# Altium footprint library 常用元件封装库.PcbLib: 1310 footprints (part 15 of 83)
Each footprint in its own frame and in the unit in brackets; x right, y up, seen from the top. Pads: shape width x height; smd on the part's side, far side on the other; paste and mask are expansions set on the pad; w line width, h text height; cw(c..) or ccw(c..) is an arc to the next point about the centre after c.
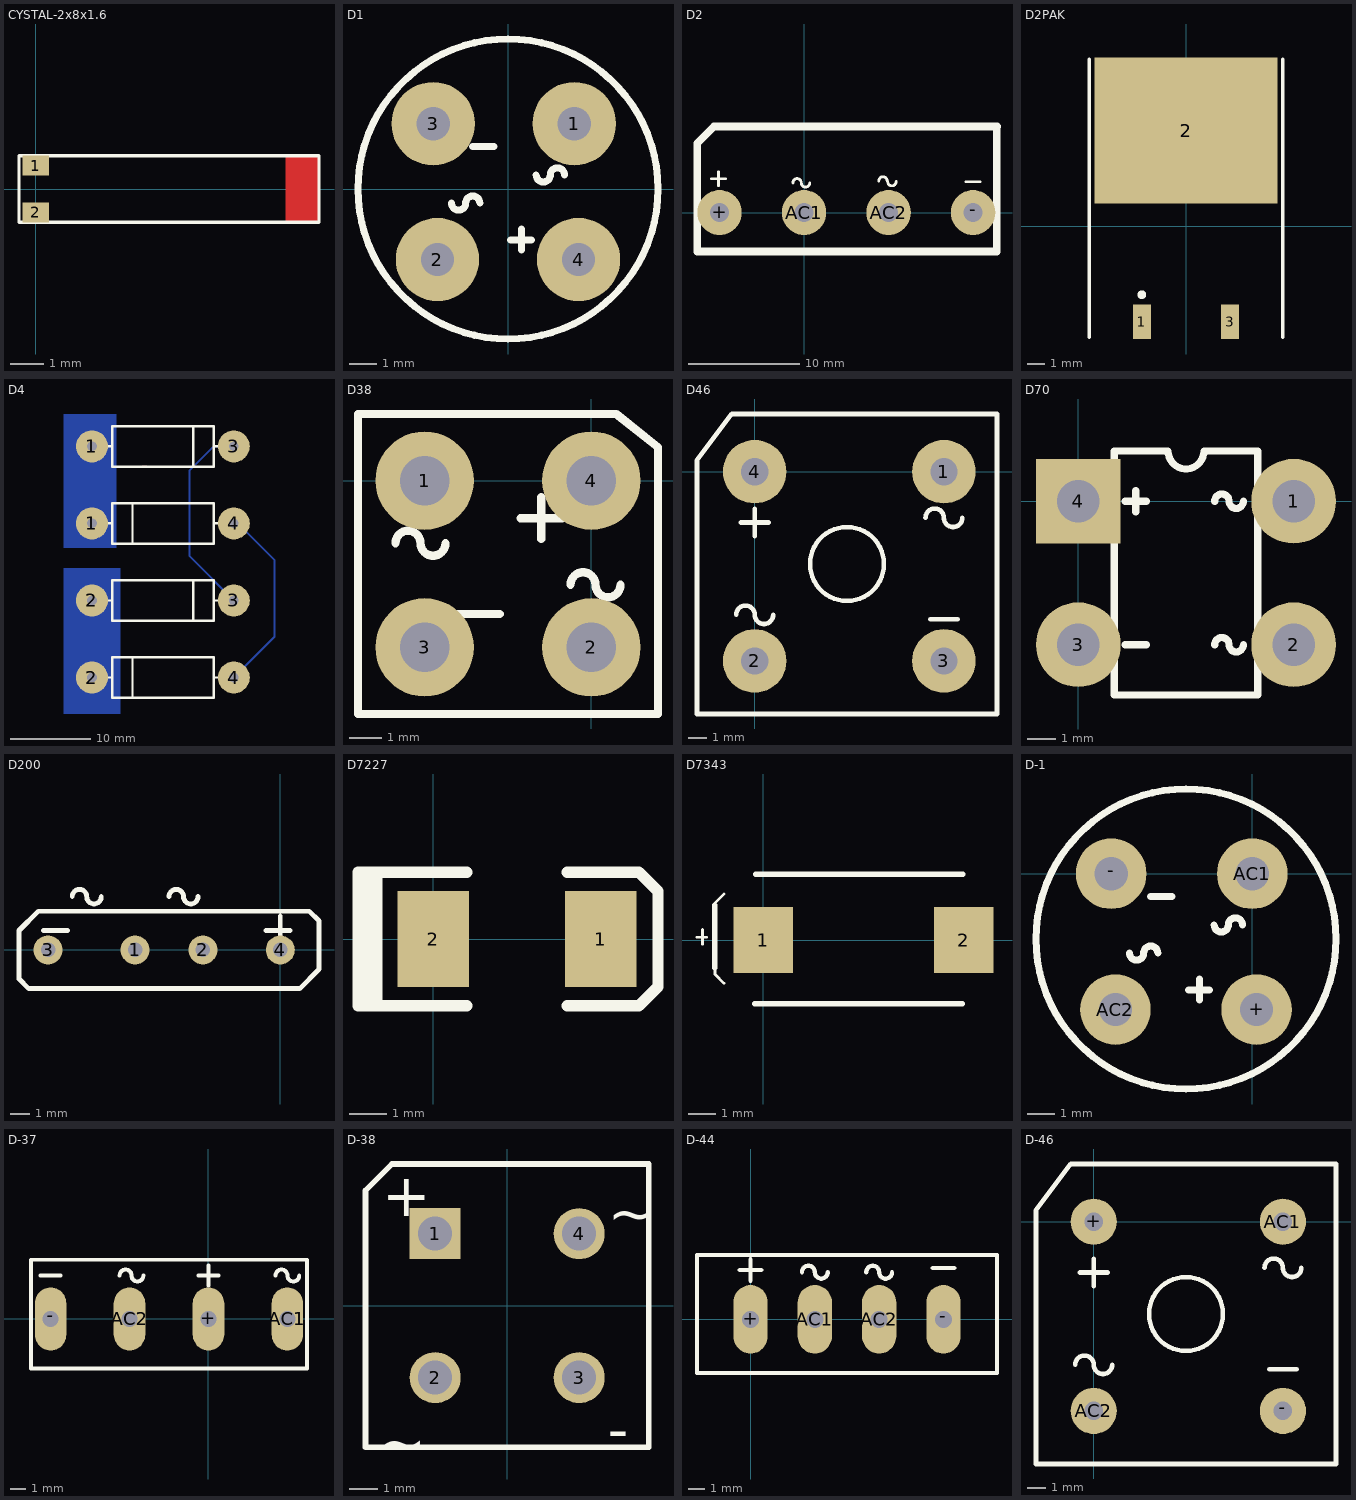
[diagram p14: the footprints below, top view; thin cyan lines are the x and y axes]

## CYSTAL-2x8x1.6 [mm]
pads (2):
  rect 0.8x0.6 smd: 1(0,0.7) 2(0,-0.7)
Top Layer:
  rectangle: 7.5,-1 8.5,1
Top Overlay:
  lines w0.102: -0.5,-1 -0.5,1 8.5,1 8.5,-1 -0.5,-1

## D1 [mm]
pads (4):
  round 3 hole 1.2: 1(2.387,2.351) 2(-2.54,-2.54) 3(-2.693,2.351) 4(2.54,-2.54)
Top Overlay:
  circle w0.254: c0,0 r5.4
  lines w0.254: -2.032,-0.508 ccw(c-1.778,-0.508) -1.524,-0.508 cw(c-1.27,-0.508) -1.016,-0.508 ; -1.27,1.524 -0.508,1.524 ; 0.091,-1.833 0.853,-1.833 ; 0.491,-2.195 0.491,-1.433 ; 1.016,0.508 ccw(c1.27,0.508) 1.524,0.508 cw(c1.778,0.508) 2.032,0.508

## D2 [mm]
pads (4):
  oval 4x4.064 hole 1.7: +(-7.62,0) -(15.24,0) AC1(0,0) AC2(7.62,0)
Top Overlay:
  lines w0.254: -8.345,3.048 -7.075,3.048 ; -7.71,2.413 -7.71,3.683 ; -1.01,2.679 cw(c-0.629,2.679) -0.248,2.679 ccw(c0.133,2.679) 0.514,2.679 ; 6.731,2.846 cw(c7.112,2.846) 7.493,2.846 ; 7.543,2.792 ccw(c7.924,2.792) 8.305,2.792 ; 14.585,2.779 15.855,2.779
  lines w0.7: -9.63,-3.5 17.37,-3.5 17.37,6.25 17.37,7.725 17.395,7.75 -8.13,7.75 -9.63,6.25 -9.63,-3.5

## D2PAK [mm] "D2-PAK/TO-263-AB; 3 Leads (1 Cropped); Body 15.5 (inc. leads) x 10.5 mm (LxW max)"
height 4.69
pads (3):
  rect 1.05x2 smd: 1(-2.54,-5.5) 3(2.54,-5.5)
  rect 10.55x8.4 smd: 2(0,5.5)
Top Overlay:
  circle w0.25: c-2.54,-3.95 r0.125
  lines w0.2: -5.575,-6.4 -5.575,9.6 ; 5.575,-6.4 5.575,9.6

## D4 [mm]
pads (8):
  round 4 hole 1.2: 1(-120.904,204.216) 1(-120.904,213.868) 2(-120.904,184.912) 2(-120.904,194.564) 3(-103.124,194.564) 3(-103.124,213.868) 4(-103.124,184.912) 4(-103.124,204.216)
Top Layer:
  lines w0.254: -114.554,206.756 -114.046,206.756 ; -114.554,211.328 -114.046,211.328
Bottom Layer:
  rectangle: -124.46,180.34 -117.348,198.628
  rectangle: -124.46,201.168 -117.856,217.932
  lines w0.254: -120.904,184.912 -120.904,194.564 ; -120.904,204.216 -120.904,213.868 ; -103.124,184.912 -98.044,189.992 -98.044,199.644 -102.616,204.216 -103.124,204.216 ; -103.124,194.564 -108.712,200.152 -108.712,210.82 -105.664,213.868 -103.124,213.868
Top Overlay:
  lines w0.305: -119.38,184.912 -118.364,184.912 ; -119.38,194.564 -118.364,194.564 ; -119.38,204.216 -118.364,204.216 ; -119.38,213.868 -118.364,213.868 ; -115.824,182.372 -115.824,187.452 ; -115.824,201.676 -115.824,206.756 ; -108.204,192.024 -108.204,197.104 ; -108.204,211.328 -108.204,216.408 ; -105.664,184.912 -104.648,184.912 ; -105.664,194.564 -104.648,194.564 ; -105.664,204.216 -104.648,204.216 ; -105.664,213.868 -104.648,213.868 ; -118.364,182.372 -105.664,182.372 -105.664,187.452 -118.364,187.452 -118.364,182.372 ; -118.364,192.024 -118.364,197.104 -105.664,197.104 -105.664,192.024 -118.364,192.024 ; -118.364,201.676 -105.664,201.676 -105.664,206.756 -118.364,206.756 -118.364,201.676 ; -118.364,211.328 -118.364,216.408 -105.664,216.408 -105.664,211.328 -118.364,211.328

## D38 [mm]
pads (4):
  round 3 hole 1.5: 1(-5.08,0) 2(0,-5.08) 3(-5.08,-5.08) 4(0,0)
Top Overlay:
  lines w0.254: -5.969,-1.905 cw(c-5.588,-1.905) -5.207,-1.905 ccw(c-4.826,-1.905) -4.445,-1.905 ; -4.064,-4.064 -2.794,-4.064 ; -2.159,-1.143 -0.889,-1.143 ; -1.524,-1.778 -1.524,-0.508 ; -0.635,-3.175 cw(c-0.254,-3.175) 0.127,-3.175 ccw(c0.508,-3.175) 0.889,-3.175 ; -7.112,-7.112 -7.112,2.032 0.762,2.032 2.032,1.016 2.032,-7.112 -7.112,-7.112

## D46 [mm]
pads (4):
  round 3.5 hole 1.5: 1(10.414,0) 2(0,-10.414) 3(10.414,-10.414) 4(0,0)
Top Overlay:
  circle w0.254: c5.08,-5.08 r2.032
  lines w0.254: -1.016,-7.874 cw(c-0.508,-7.874) 0,-7.874 ccw(c0.508,-7.874) 1.016,-7.874 ; -0.762,-2.794 0.762,-2.794 ; 0,-3.556 0,-2.032 ; 9.398,-2.54 cw(c9.906,-2.54) 10.414,-2.54 ccw(c10.922,-2.54) 11.43,-2.54 ; 9.652,-8.128 10.414,-8.128 11.176,-8.128 ; -3.175,-13.335 13.335,-13.335 13.335,3.175 -1.27,3.175 -3.175,0.635 -3.175,-13.335

## D70 [mm]
pads (4):
  round 3 hole 1.5: 1(7.62,0) 2(7.62,-5.08) 3(0,-5.08)
  rect 3x3 hole 1.5: 4(0,0)
Top Overlay:
  lines w0.254: 1.651,-5.08 2.413,-5.08 ; 1.651,0 2.413,0 ; 2.032,-0.381 2.032,0.381 ; 4.826,-5.08 cw(c5.08,-5.08) 5.334,-5.08 ccw(c5.588,-5.08) 5.842,-5.08 ; 4.826,0 cw(c5.08,0) 5.334,0 ccw(c5.588,0) 5.842,0 ; 1.27,-6.858 6.35,-6.858 6.35,1.778 4.445,1.778 cw(c3.81,1.778) 3.175,1.778 1.27,1.778 1.27,-6.858

## D200 [mil]
pads (4):
  round 60 hole 30: 1(-300,0) 2(-160,0) 3(-480,0) 4(0,0)
Top Overlay:
  lines w10: -490,40 -440,40 ; -430,110 cw(c-415,110) -400,110 ccw(c-385,110) -370,110 ; -230,110 cw(c-215,110) -200,110 ccw(c-185,110) -170,110 ; -30,40 20,40 ; 0,20 0,70 ; -540,-60 -520,-80 40,-80 80,-40 80,60 60,80 -500,80 -540,40 -540,-60

## D7227 [mil]
height 503.94
pads (2):
  rect 75x100 smd: 1(175,0) 2(0,0)
Top Overlay:
  lines w12: -70.87,-70 -70.87,70 ; -59.06,-70 -59.06,70 ; 35,-70 -78.74,-70 -78.74,70 35,70 ; 140,-70 215,-70 235,-50 235,50 215,70 140,70
3D body "User Library-Diode Molded BodyDIOM5025X231N.STEP": height -15.61, standoff -106.55, extent -8.42,-53.14 188.43,53.16

## D7343 [mm] "钽电容"
height 3
pads (2):
  rect 2.16x2.41 smd: 1(0,0) 2(7.3,0)
Top Overlay:
  lines w0.102: -2.413,0.102 -2.057,0.102 ; -2.21,-0.152 -2.21,0.381 ; -1.763,-1.016 -1.763,-1.245 -1.433,-1.575 ; -1.763,1.27 -1.763,1.346 -1.433,1.676
  lines w0.2: -1.763,-1.016 -1.763,1.27 ; -0.305,-2.311 7.239,-2.311 ; -0.279,2.388 7.264,2.388
3D body "User Library-CAP_TANT_7343-31.STEP": height 3.1, standoff 0, extent -0.3,-2.3 7.3,2.3

## D-1 [mm]
pads (4):
  round 2.54 hole 1.2: +(0.153,-4.891) -(-5.08,0) AC1(0,0) AC2(-4.927,-4.891)
Top Overlay:
  circle w0.254: c-2.387,-2.351 r5.4
  lines w0.254: -4.419,-2.859 ccw(c-4.165,-2.859) -3.911,-2.859 cw(c-3.657,-2.859) -3.403,-2.859 ; -3.657,-0.827 -2.895,-0.827 ; -2.296,-4.184 -1.534,-4.184 ; -1.896,-4.546 -1.896,-3.784 ; -1.371,-1.843 ccw(c-1.117,-1.843) -0.863,-1.843 cw(c-0.609,-1.843) -0.355,-1.843

## D-37 [mil]
pads (4):
  oval 80x160 hole 40: +(0,0) -(-400,0) AC1(200,0) AC2(-200,0)
Top Overlay:
  lines w10: -425,110 -375,110 ; -225,110 cw(c-210,110) -195,110 ccw(c-180,110) -165,110 ; -25,110 25,110 ; 0,85 0,135 ; 170,110 cw(c185,110) 200,110 ccw(c215,110) 230,110 ; -450,-125 250,-125 250,150 -450,150 -450,-125

## D-38 [mm] "Bridge Rectifier; 4 Terminals; Body 9.4 x 9.4 mm (typ); Pitch 5.08 mm"
height 9.91
pads (4):
  rect 1.8x1.8 hole 1.2: 1(-2.54,2.54)
  round 1.8 hole 1.2: 2(-2.54,-2.54) 3(2.54,-2.54) 4(2.54,2.54)
Top Overlay:
  lines w0.2: -5,-5 -5,4.064 -4.064,5 5,5 5,-5 -5,-5
  text "+" at -4.41,3.164 h1.5
  text "-" at 3.556,-5.08 h1.5
  text "~" at -4.572,-5.588 h1.5
  text "~" at 3.556,2.54 h1.5

## D-44 [mil]
pads (4):
  oval 80x160 hole 40: +(0,0) -(450,0) AC1(150,0) AC2(300,0)
Top Overlay:
  lines w10: -25,115 25,115 ; 0,90 0,140 ; 120,110 cw(c135,110) 150,110 ccw(c165,110) 180,110 ; 270,110 cw(c285,110) 300,110 ccw(c315,110) 330,110 ; 425,120 475,120 ; -125,-125 575,-125 575,150 -125,150 -125,-125

## D-46 [mil]
pads (4):
  round 100 hole 40: +(0,0) -(410,-410) AC1(410,0) AC2(0,-410)
Top Overlay:
  circle w10: c200,-200 r80
  lines w10: -40,-310 cw(c-20,-310) 0,-310 ccw(c20,-310) 40,-310 ; -30,-110 30,-110 ; 0,-140 0,-80 ; 370,-100 cw(c390,-100) 410,-100 ccw(c430,-100) 450,-100 ; 380,-320 410,-320 440,-320 ; -125,-525 525,-525 525,125 -50,125 -125,25 -125,-525